# Altium footprint library 6-Connectors-5.PcbLib: 46 footprints (part 1 of 5)
Each footprint in its own frame and in the unit in brackets; x right, y up, seen from the top. Pads: shape width x height; smd on the part's side, far side on the other; paste and mask are expansions set on the pad; w line width, h text height; cw(c..) or ccw(c..) is an arc to the next point about the centre after c.
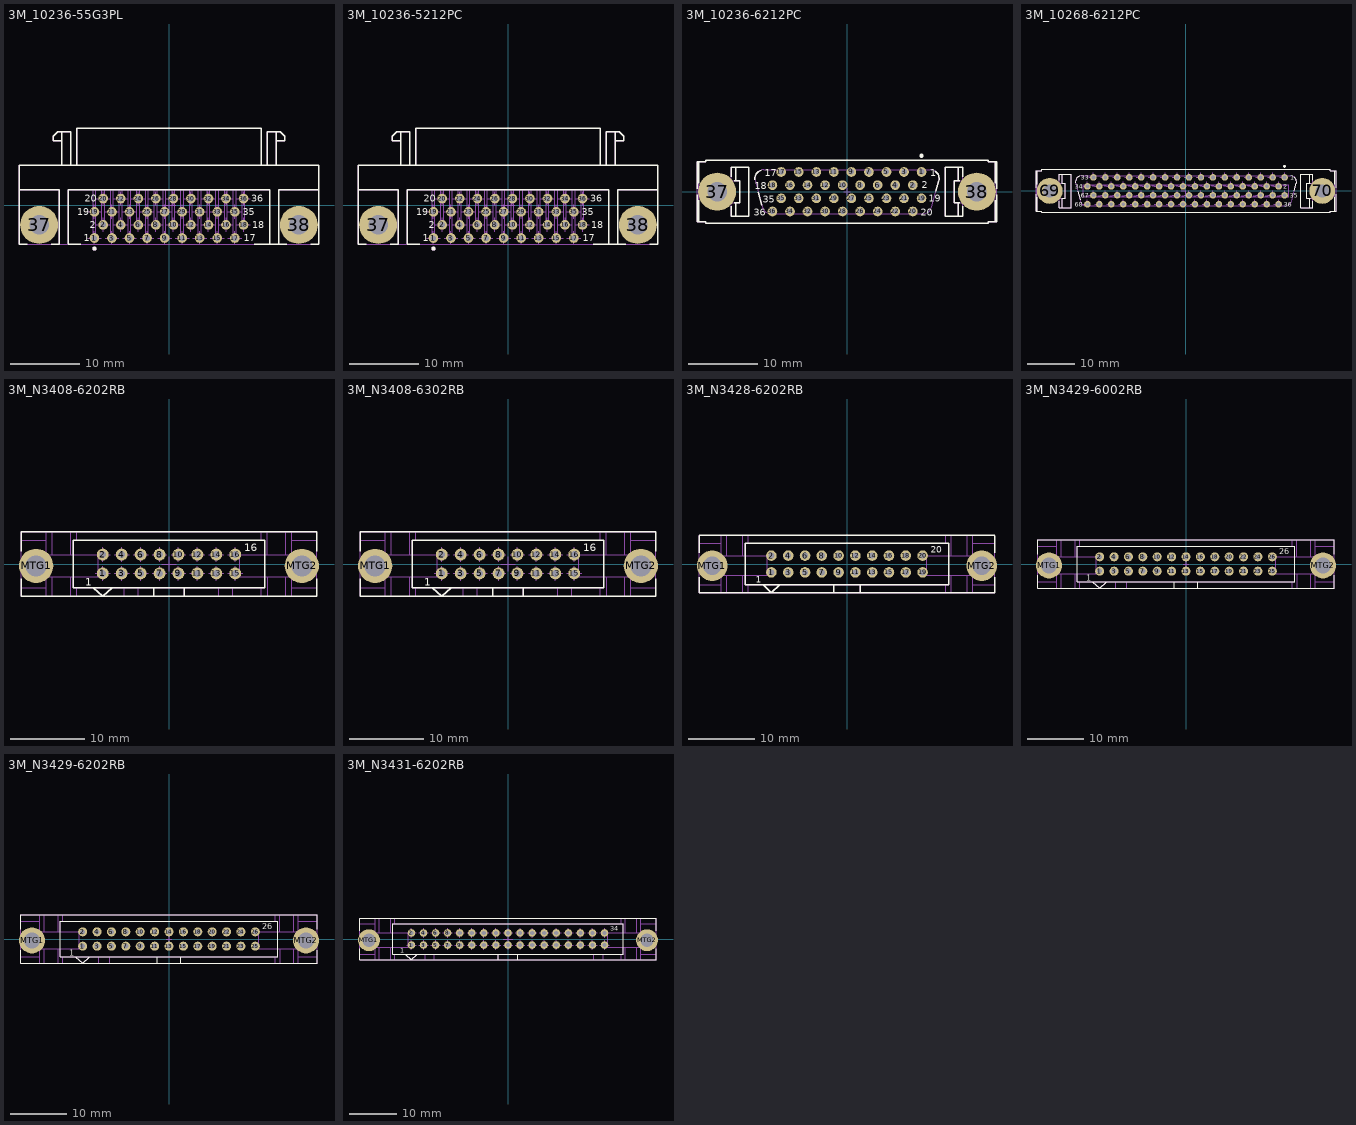
[diagram p0: the footprints below, top view; thin cyan lines are the x and y axes]

## 3M_10236-55G3PL [mm] "36 contacts, Mini D Ribbon (MDR), 102 Series, .050\" Boardmount Through-hole Right Angle Receptacle-Shielded"
height 9.4
pads (38):
  round 1.4 hole 0.8: 1(-10.795,-4.758) 2(-9.525,-2.853) 3(-8.255,-4.758) 4(-6.985,-2.853) 5(-5.715,-4.758) 6(-4.445,-2.853) 7(-3.175,-4.758) 8(-1.905,-2.853) 9(-0.635,-4.758) 10(0.635,-2.853) 11(1.905,-4.758) 12(3.175,-2.853) 13(4.445,-4.758) 14(5.715,-2.853) 15(6.985,-4.758) 16(8.255,-2.853) 17(9.525,-4.758) 18(10.795,-2.853) 19(-10.795,-0.957) 20(-9.525,0.957) 21(-8.255,-0.957) 22(-6.985,0.957) 23(-5.715,-0.957) 24(-4.445,0.957) 25(-3.175,-0.957) 26(-1.905,0.957) 27(-0.635,-0.957) 28(0.635,0.957) 29(1.905,-0.957) 30(3.175,0.957) 31(4.445,-0.957) 32(5.715,0.957) 33(6.985,-0.957) 34(8.255,0.957) 35(9.525,-0.957) 36(10.795,0.957)
  round 5.5 hole 2.8: 37(-18.796,-2.853) 38(18.796,-2.853)
Top Overlay:
  circle w0.3: c-10.795,-6.282 r0.15
  lines w0.2: -21.717,2.227 -15.875,2.227 -15.875,-5.647 -17.084,-5.647 ; -20.508,-5.647 -21.717,-5.647 -21.717,5.783 21.717,5.783 21.717,-5.647 20.508,-5.647 ; -15.494,5.783 -15.494,10.609 ; -15.494,9.339 -16.764,9.339 -16.764,9.974 -16.129,10.609 -14.224,10.609 -14.224,5.783 ; -13.335,5.783 -13.335,11.117 13.334,11.117 13.336,5.783 ; -12.77,-5.647 -14.605,-5.647 -14.605,2.227 14.605,2.227 14.605,-5.647 ; 12.349,-5.647 15.875,-5.647 ; 14.224,5.783 14.224,10.609 16.129,10.609 16.764,9.974 16.764,9.339 15.494,9.339 ; 15.494,5.783 15.494,10.609 ; 17.084,-5.647 15.875,-5.647 ; 21.717,2.227 15.875,2.227 15.875,-5.647
  text "36" at 11.935,0.468 h1.02
  text "18" at 12.06,-3.342 h1.02
  text "17" at 10.8,-5.247 h1.02
  text "35" at 10.675,-1.446 h1.02
  text "19" at -13.315,-1.441 h1.02
  text "20" at -12.195,0.473 h1.02
  text "2" at -11.495,-3.337 h1.02
  text "1" at -12.365,-5.242 h1.02
Mechanical 8:
  drawing of 156 lines, arcs and shapes, not listed
Mechanical 14:
  circle w0.3: c-10.795,-6.282 r0.15
  lines w0.1: -21.717,2.227 -15.875,2.227 -15.875,-5.647 ; -15.494,5.783 -15.494,10.609 ; -15.494,9.339 -16.764,9.339 -16.764,9.974 -16.129,10.609 -14.224,10.609 -14.224,5.783 ; -14.605,-5.647 -14.605,2.227 14.605,2.227 14.605,-5.647 ; -13.335,5.783 -13.335,11.117 13.334,11.117 13.336,5.783 ; -10.994,2.227 -10.994,-4.957 -10.596,-4.957 -10.596,2.227 ; -9.724,2.227 -9.724,-3.052 -9.326,-3.052 -9.326,2.227 ; -8.454,2.227 -8.454,-4.957 -8.056,-4.957 -8.056,2.227 ; -7.184,2.227 -7.184,-3.052 -6.786,-3.052 -6.786,2.227 ; -5.914,2.227 -5.914,-4.957 -5.516,-4.957 -5.516,2.227 ; -4.644,2.227 -4.644,-3.052 -4.246,-3.052 -4.246,2.227 ; -3.374,2.227 -3.374,-4.957 -2.976,-4.957 -2.976,2.227 ; -2.104,2.227 -2.104,-3.052 -1.706,-3.052 -1.706,2.227 ; -0.834,2.227 -0.834,-4.957 -0.436,-4.957 -0.436,2.227 ; 0.436,2.227 0.436,-3.052 0.834,-3.052 0.834,2.227 ; 1.706,2.227 1.706,-4.957 2.104,-4.957 2.104,2.227 ; 2.976,2.227 2.976,-3.052 3.374,-3.052 3.374,2.227 ; 4.246,2.227 4.246,-4.957 4.644,-4.957 4.644,2.227 ; 5.516,2.227 5.516,-3.052 5.914,-3.052 5.914,2.227 ; 6.786,2.227 6.786,-4.957 7.184,-4.957 7.184,2.227 ; 8.056,2.227 8.056,-3.052 8.454,-3.052 8.454,2.227 ; 9.326,2.227 9.326,-4.957 9.724,-4.957 9.724,2.227 ; 10.596,2.227 10.596,-3.052 10.994,-3.052 10.994,2.227 ; 14.224,5.783 14.224,10.609 16.129,10.609 16.764,9.974 16.764,9.339 15.494,9.339 ; 15.494,5.783 15.494,10.609 ; 15.875,-5.647 15.875,2.227 21.717,2.227 ; -21.717,-5.647 21.717,-5.647 21.717,5.783 -21.717,5.783 -21.717,-5.647 ; -19.05,-5.031 -18.542,-5.031 -18.542,-4.071 ccw(c-18.796,-2.853) -18.542,-1.634 -18.542,-0.675 -19.05,-0.675 -19.05,-1.634 ccw(c-18.796,-2.853) -19.05,-4.071 -19.05,-5.031 ; 18.542,-5.031 19.05,-5.031 19.05,-4.071 ccw(c18.796,-2.853) 19.05,-1.634 19.05,-0.675 18.542,-0.675 18.542,-1.634 ccw(c18.796,-2.853) 18.542,-4.071 18.542,-5.031
  text "36" at 11.935,0.468 h1.02
  text "18" at 12.06,-3.342 h1.02
  text "17" at 10.8,-5.247 h1.02
  text "35" at 10.675,-1.446 h1.02
  text "19" at -13.315,-1.441 h1.02
  text "20" at -12.195,0.473 h1.02
  text "2" at -11.495,-3.337 h1.02
  text "1" at -12.365,-5.242 h1.02
3D body "3M_10236-55G3PL.stp": height 9.4, standoff -3.81, extent -21.717,-5.647 21.717,11.117

## 3M_10236-5212PC [mm] "36 contacts, Mini D Ribbon (MDR), 102 Series, .050\" Boardmount Through-hole Right Angle Receptacle-Shielded"
height 9.4
pads (38):
  round 1.4 hole 0.8: 1(-10.795,-4.758) 2(-9.525,-2.853) 3(-8.255,-4.758) 4(-6.985,-2.853) 5(-5.715,-4.758) 6(-4.445,-2.853) 7(-3.175,-4.758) 8(-1.905,-2.853) 9(-0.635,-4.758) 10(0.635,-2.853) 11(1.905,-4.758) 12(3.175,-2.853) 13(4.445,-4.758) 14(5.715,-2.853) 15(6.985,-4.758) 16(8.255,-2.853) 17(9.525,-4.758) 18(10.795,-2.853) 19(-10.795,-0.957) 20(-9.525,0.957) 21(-8.255,-0.957) 22(-6.985,0.957) 23(-5.715,-0.957) 24(-4.445,0.957) 25(-3.175,-0.957) 26(-1.905,0.957) 27(-0.635,-0.957) 28(0.635,0.957) 29(1.905,-0.957) 30(3.175,0.957) 31(4.445,-0.957) 32(5.715,0.957) 33(6.985,-0.957) 34(8.255,0.957) 35(9.525,-0.957) 36(10.795,0.957)
  round 5.5 hole 2.8: 37(-18.796,-2.853) 38(18.796,-2.853)
Top Overlay:
  circle w0.3: c-10.795,-6.282 r0.15
  lines w0.2: -21.717,2.227 -15.875,2.227 -15.875,-5.647 -17.084,-5.647 ; -20.508,-5.647 -21.717,-5.647 -21.717,5.783 21.717,5.783 21.717,-5.647 20.508,-5.647 ; -15.494,5.783 -15.494,10.609 ; -15.494,9.339 -16.764,9.339 -16.764,9.974 -16.129,10.609 -14.224,10.609 -14.224,5.783 ; -13.335,5.783 -13.335,11.117 13.334,11.117 13.336,5.783 ; -12.77,-5.647 -14.605,-5.647 -14.605,2.227 14.605,2.227 14.605,-5.647 ; 12.349,-5.647 15.875,-5.647 ; 14.224,5.783 14.224,10.609 16.129,10.609 16.764,9.974 16.764,9.339 15.494,9.339 ; 15.494,5.783 15.494,10.609 ; 17.084,-5.647 15.875,-5.647 ; 21.717,2.227 15.875,2.227 15.875,-5.647
  text "1" at -12.365,-5.242 h1.02
  text "2" at -11.495,-3.337 h1.02
  text "20" at -12.195,0.473 h1.02
  text "19" at -13.315,-1.441 h1.02
  text "35" at 10.675,-1.446 h1.02
  text "17" at 10.8,-5.247 h1.02
  text "18" at 12.06,-3.342 h1.02
  text "36" at 11.935,0.468 h1.02
Mechanical 8:
  drawing of 156 lines, arcs and shapes, not listed
Mechanical 14:
  circle w0.3: c-10.795,-6.282 r0.15
  lines w0.1: -21.717,2.227 -15.875,2.227 -15.875,-5.647 ; -15.494,5.783 -15.494,10.609 ; -15.494,9.339 -16.764,9.339 -16.764,9.974 -16.129,10.609 -14.224,10.609 -14.224,5.783 ; -14.605,-5.647 -14.605,2.227 14.605,2.227 14.605,-5.647 ; -13.335,5.783 -13.335,11.117 13.334,11.117 13.336,5.783 ; -10.994,2.227 -10.994,-4.957 -10.596,-4.957 -10.596,2.227 ; -9.724,2.227 -9.724,-3.052 -9.326,-3.052 -9.326,2.227 ; -8.454,2.227 -8.454,-4.957 -8.056,-4.957 -8.056,2.227 ; -7.184,2.227 -7.184,-3.052 -6.786,-3.052 -6.786,2.227 ; -5.914,2.227 -5.914,-4.957 -5.516,-4.957 -5.516,2.227 ; -4.644,2.227 -4.644,-3.052 -4.246,-3.052 -4.246,2.227 ; -3.374,2.227 -3.374,-4.957 -2.976,-4.957 -2.976,2.227 ; -2.104,2.227 -2.104,-3.052 -1.706,-3.052 -1.706,2.227 ; -0.834,2.227 -0.834,-4.957 -0.436,-4.957 -0.436,2.227 ; 0.436,2.227 0.436,-3.052 0.834,-3.052 0.834,2.227 ; 1.706,2.227 1.706,-4.957 2.104,-4.957 2.104,2.227 ; 2.976,2.227 2.976,-3.052 3.374,-3.052 3.374,2.227 ; 4.246,2.227 4.246,-4.957 4.644,-4.957 4.644,2.227 ; 5.516,2.227 5.516,-3.052 5.914,-3.052 5.914,2.227 ; 6.786,2.227 6.786,-4.957 7.184,-4.957 7.184,2.227 ; 8.056,2.227 8.056,-3.052 8.454,-3.052 8.454,2.227 ; 9.326,2.227 9.326,-4.957 9.724,-4.957 9.724,2.227 ; 10.596,2.227 10.596,-3.052 10.994,-3.052 10.994,2.227 ; 14.224,5.783 14.224,10.609 16.129,10.609 16.764,9.974 16.764,9.339 15.494,9.339 ; 15.494,5.783 15.494,10.609 ; 15.875,-5.647 15.875,2.227 21.717,2.227 ; -21.717,-5.647 21.717,-5.647 21.717,5.783 -21.717,5.783 -21.717,-5.647 ; -19.05,-5.031 -18.542,-5.031 -18.542,-4.071 ccw(c-18.796,-2.853) -18.542,-1.634 -18.542,-0.675 -19.05,-0.675 -19.05,-1.634 ccw(c-18.796,-2.853) -19.05,-4.071 -19.05,-5.031 ; 18.542,-5.031 19.05,-5.031 19.05,-4.071 ccw(c18.796,-2.853) 19.05,-1.634 19.05,-0.675 18.542,-0.675 18.542,-1.634 ccw(c18.796,-2.853) 18.542,-4.071 18.542,-5.031
  text "1" at -12.365,-5.242 h1.02
  text "2" at -11.495,-3.337 h1.02
  text "20" at -12.195,0.473 h1.02
  text "19" at -13.315,-1.441 h1.02
  text "35" at 10.675,-1.446 h1.02
  text "17" at 10.8,-5.247 h1.02
  text "18" at 12.06,-3.342 h1.02
  text "36" at 11.935,0.468 h1.02
3D body "v160-080.stp": height 0.02, standoff -1.65, extent -11.595,-1.757 -9.995,-0.157
3D body "v160-080.stp": height 0.02, standoff -1.65, extent -7.785,0.157 -6.185,1.757
3D body "v160-080.stp": height 0.02, standoff -1.65, extent -10.325,0.157 -8.725,1.757
3D body "3M_10236-5212PC.stp": height 9.4, standoff -3.81, extent -21.717,-5.647 21.717,11.117

## 3M_10236-6212PC [mm] "36 contacts, Mini D Ribbon (MDR), 102 Series, .050\" Boardmount Through-hole Vertical Receptacle-Shielded"
height 9.4
pads (38):
  round 1.4 hole 0.8: 1(10.795,2.86) 2(9.525,0.955) 3(8.255,2.86) 4(6.985,0.955) 5(5.715,2.86) 6(4.445,0.955) 7(3.175,2.86) 8(1.905,0.955) 9(0.635,2.86) 10(-0.635,0.955) 11(-1.905,2.86) 12(-3.175,0.955) 13(-4.445,2.86) 14(-5.715,0.955) 15(-6.985,2.86) 16(-8.255,0.955) 17(-9.525,2.86) 18(-10.795,0.955) 19(10.795,-0.955) 20(9.525,-2.86) 21(8.255,-0.955) 22(6.985,-2.86) 23(5.715,-0.955) 24(4.445,-2.86) 25(3.175,-0.955) 26(1.905,-2.86) 27(0.635,-0.955) 28(-0.635,-2.86) 29(-1.905,-0.955) 30(-3.175,-2.86) 31(-4.445,-0.955) 32(-5.715,-2.86) 33(-6.985,-0.955) 34(-8.255,-2.86) 35(-9.525,-0.955) 36(-10.795,-2.86)
  round 5.5 hole 2.8: 37(-18.796,0) 38(18.796,0)
Top Overlay:
  circle w0.3: c10.795,5.207 r0.15
  lines w0.2: -21.717,-0.413 -21.717,-4.318 -20.447,-4.318 -20.447,-4.572 20.447,-4.572 20.447,-4.318 21.717,-4.318 21.717,-0.413 ; -21.717,0.413 -21.717,4.318 -20.447,4.318 -20.447,4.572 20.447,4.572 20.447,4.318 21.717,4.318 21.717,0.413 ; -21.463,-4.318 -21.463,-1.261 ; -21.463,1.261 -21.463,4.318 ; -16.764,-2.139 -16.764,-3.556 -14.224,-3.556 -14.224,3.556 -16.764,3.556 -16.764,2.139 ; -16.31,-1.587 -15.494,-1.587 -15.494,1.587 -16.31,1.587 ; -16.129,-3.556 -16.129,-1.587 ; -16.129,1.587 -16.129,3.556 ; -13.323,1.725 cw(c-12.065,1.896) -12.392,3.123 ; -12.86,-0.044 -12.355,-1.928 ; 12.811,2.933 cw(c12.065,1.905) 13.292,1.576 12.878,0.032 ; 16.129,-3.556 16.129,-1.587 ; 16.129,1.587 16.129,3.556 ; 16.31,-1.587 15.494,-1.587 15.494,1.587 16.31,1.587 ; 16.764,-2.139 16.764,-3.556 14.224,-3.556 14.224,3.556 16.764,3.556 16.764,2.139 ; 21.463,-4.318 21.463,-1.261 ; 21.463,1.261 21.463,4.318
  text "1" at 12.019,2.246 h1.02
  text "2" at 10.857,0.468 h1.02
  text "20" at 10.665,-3.459 h1.02
  text "19" at 11.831,-1.436 h1.02
  text "35" at -12.185,-1.569 h1.02
  text "17" at -11.933,2.241 h1.02
  text "18" at -13.34,0.336 h1.02
  text "36" at -13.465,-3.464 h1.02
Mechanical 8:
  drawing of 156 lines, arcs and shapes, not listed
Mechanical 14:
  circle w0.1: c18.796,0 r1.245
  circle w0.1: c-18.796,0 r1.245
  lines w0.1: -21.463,-4.318 -21.463,4.318 ; -16.129,-3.556 -16.129,-1.587 ; -16.129,1.587 -16.129,3.556 ; 16.129,-3.556 16.129,-1.587 ; 16.129,1.587 16.129,3.556 ; 21.463,-4.318 21.463,4.318 ; -21.717,-4.318 -20.447,-4.318 -20.447,-4.572 20.447,-4.572 20.447,-4.318 21.717,-4.318 21.717,4.318 20.447,4.318 20.447,4.572 -20.447,4.572 -20.447,4.318 -21.717,4.318 -21.717,-4.318 ; -16.764,-3.556 -14.224,-3.556 -14.224,3.556 -16.764,3.556 -16.764,1.587 -15.494,1.587 -15.494,-1.587 -16.764,-1.587 -16.764,-3.556 ; -13.292,1.576 cw(c-12.065,1.905) -12.065,3.175 12.065,3.175 cw(c12.065,1.905) 13.292,1.576 12.286,-2.178 cw(c11.015,-1.868) 10.987,-3.175 -10.987,-3.175 cw(c-11.015,-1.868) -12.286,-2.178 -13.292,1.576 ; 14.224,-3.556 16.764,-3.556 16.764,-1.587 15.494,-1.587 15.494,1.587 16.764,1.587 16.764,3.556 14.224,3.556 14.224,-3.556
  text "35" at -12.185,-1.569 h1.02
  text "17" at -11.933,2.241 h1.02
  text "18" at -13.34,0.336 h1.02
  text "36" at -13.465,-3.464 h1.02
  text "1" at 12.019,2.246 h1.02
  text "2" at 10.857,0.468 h1.02
  text "20" at 10.665,-3.459 h1.02
  text "19" at 11.831,-1.436 h1.02
3D body "3M_10236-6212PC.stp": height 11.18, standoff -3.4, extent -21.717,-4.572 21.717,4.572

## 3M_10268-6212PC [mm] "68 contacts, Mini D Ribbon (MDR), .050\" Boardmount Through-hole Vertical Receptacle - Shielded"
height 11
pads (70):
  round 1.4 hole 0.8: 1(20.955,2.858) 2(19.685,0.953) 3(18.415,2.858) 4(17.145,0.953) 5(15.875,2.858) 6(14.605,0.953) 7(13.335,2.858) 8(12.065,0.953) 9(10.795,2.858) 10(9.525,0.953) 11(8.255,2.858) 12(6.985,0.953) 13(5.715,2.858) 14(4.445,0.953) 15(3.175,2.858) 16(1.905,0.953) 17(0.635,2.858) 18(-0.635,0.953) 19(-1.905,2.858) 20(-3.175,0.953) 21(-4.445,2.858) 22(-5.715,0.953) 23(-6.985,2.858) 24(-8.255,0.953) 25(-9.525,2.858) 26(-10.795,0.953) 27(-12.065,2.858) 28(-13.335,0.953) 29(-14.605,2.858) 30(-15.875,0.953) 31(-17.145,2.858) 32(-18.415,0.953) 33(-19.685,2.858) 34(-20.955,0.953) 35(20.955,-0.952) 36(19.685,-2.857) 37(18.415,-0.952) 38(17.145,-2.857) 39(15.875,-0.952) 40(14.605,-2.857) 41(13.335,-0.952) 42(12.065,-2.857) 43(10.795,-0.952) 44(9.525,-2.857) 45(8.255,-0.952) 46(6.985,-2.857) 47(5.715,-0.952) 48(4.445,-2.857) 49(3.175,-0.952) 50(1.905,-2.857) 51(0.635,-0.952) 52(-0.635,-2.857) 53(-1.905,-0.952) 54(-3.175,-2.857) 55(-4.445,-0.952) 56(-5.715,-2.857) 57(-6.985,-0.952) 58(-8.255,-2.857) 59(-9.525,-0.952) 60(-10.795,-2.857) 61(-12.065,-0.952) 62(-13.335,-2.857) 63(-14.605,-0.952) 64(-15.875,-2.857) 65(-17.145,-0.952) 66(-18.415,-2.857) 67(-19.685,-0.952) 68(-20.955,-2.857)
  round 5.5 hole 2.8: 69(-28.956,0) 70(28.956,0)
Top Overlay:
  circle w0.3: c20.955,5.207 r0.15
  lines w0.2: -31.877,-0.684 -31.877,-4.318 -30.607,-4.318 -30.607,-4.572 30.607,-4.572 30.607,-4.318 31.877,-4.318 31.877,-0.684 ; -31.877,0.684 -31.877,4.318 -30.607,4.318 -30.607,4.572 30.607,4.572 30.607,4.318 31.877,4.318 31.877,0.684 ; -31.623,-4.318 -31.623,-1.374 ; -31.623,1.374 -31.623,4.318 ; -26.924,-2.207 -26.924,-3.556 -24.384,-3.556 -24.384,3.556 -26.924,3.556 -26.924,2.207 ; -26.41,-1.587 -25.654,-1.587 -25.654,1.588 -26.41,1.588 ; -26.289,-3.556 -26.289,-1.587 ; -26.289,1.588 -26.289,3.556 ; -23.483,1.734 cw(c-22.225,1.905) -22.551,3.132 ; -23.02,-0.035 -22.515,-1.919 ; 22.971,2.933 cw(c22.225,1.905) 23.452,1.576 23.038,0.032 ; 26.289,-3.556 26.289,-1.587 ; 26.289,1.588 26.289,3.556 ; 26.41,-1.587 25.654,-1.587 25.654,1.588 26.41,1.588 ; 26.924,-2.207 26.924,-3.556 24.384,-3.556 24.384,3.556 26.924,3.556 26.924,2.207 ; 31.623,-4.318 31.623,-1.374 ; 31.623,1.374 31.623,4.318
  text "68" at -23.67,-3.357 h1.02
  text "67" at -22.4,-1.452 h1.02
  text "33" at -22.4,2.358 h1.02
  text "34" at -23.693,0.453 h1.02
  text "36" at 20.804,-3.357 h1.02
  text "35" at 22.051,-1.452 h1.02
  text "2" at 20.622,0.453 h1.02
  text "1" at 22.106,2.358 h1.02
Mechanical 8:
  lines w0.1: -29.956,0 -28.956,0 -28.956,1 ; -21.955,-2.857 -20.955,-2.857 -20.955,-1.857 ; -21.955,0.953 -20.955,0.953 -20.955,1.953 ; -20.685,-0.952 -19.685,-0.952 -19.685,0.048 ; -20.685,2.858 -19.685,2.858 -19.685,3.858 ; -19.415,-2.857 -18.415,-2.857 -18.415,-1.857 ; -19.415,0.953 -18.415,0.953 -18.415,1.953 ; -18.145,-0.952 -17.145,-0.952 -17.145,0.048 ; -18.145,2.858 -17.145,2.858 -17.145,3.858 ; -16.875,-2.857 -15.875,-2.857 -15.875,-1.857 ; -16.875,0.953 -15.875,0.953 -15.875,1.953 ; -15.605,-0.952 -14.605,-0.952 -14.605,0.048 ; -15.605,2.858 -14.605,2.858 -14.605,3.858 ; -14.335,-2.857 -13.335,-2.857 -13.335,-1.857 ; -14.335,0.953 -13.335,0.953 -13.335,1.953 ; -13.065,-0.952 -12.065,-0.952 -12.065,0.048 ; -13.065,2.858 -12.065,2.858 -12.065,3.858 ; -11.795,-2.857 -10.795,-2.857 -10.795,-1.857 ; -11.795,0.953 -10.795,0.953 -10.795,1.953 ; -10.525,-0.952 -9.525,-0.952 -9.525,0.048 ; -10.525,2.858 -9.525,2.858 -9.525,3.858 ; -9.255,-2.857 -8.255,-2.857 -8.255,-1.857 ; -9.255,0.953 -8.255,0.953 -8.255,1.953 ; -7.985,-0.952 -6.985,-0.952 -6.985,0.048 ; -7.985,2.858 -6.985,2.858 -6.985,3.858 ; -6.715,-2.857 -5.715,-2.857 -5.715,-1.857 ; -6.715,0.953 -5.715,0.953 -5.715,1.953 ; -5.445,-0.952 -4.445,-0.952 -4.445,0.048 ; -5.445,2.858 -4.445,2.858 -4.445,3.858 ; -4.175,-2.857 -3.175,-2.857 -3.175,-1.857 ; -4.175,0.953 -3.175,0.953 -3.175,1.953 ; -2.905,-0.952 -1.905,-0.952 -1.905,0.048 ; -2.905,2.858 -1.905,2.858 -1.905,3.858 ; -1.635,-2.857 -0.635,-2.857 -0.635,-1.857 ; -1.635,0.953 -0.635,0.953 -0.635,1.953 ; -1,0 0,0 0,-1 ; -0.365,-0.952 0.635,-0.952 0.635,0.048 ; -0.365,2.858 0.635,2.858 0.635,3.858 ; 0.905,-2.857 1.905,-2.857 1.905,-1.857 ; 0.905,0.953 1.905,0.953 1.905,1.953 ; 2.175,-0.952 3.175,-0.952 3.175,0.048 ; 2.175,2.858 3.175,2.858 3.175,3.858 ; 3.445,-2.857 4.445,-2.857 4.445,-1.857 ; 3.445,0.953 4.445,0.953 4.445,1.953 ; 4.715,-0.952 5.715,-0.952 5.715,0.048 ; 4.715,2.858 5.715,2.858 5.715,3.858 ; 5.985,-2.857 6.985,-2.857 6.985,-1.857 ; 5.985,0.953 6.985,0.953 6.985,1.953 ; 7.255,-0.952 8.255,-0.952 8.255,0.048 ; 7.255,2.858 8.255,2.858 8.255,3.858 ; 8.525,-2.857 9.525,-2.857 9.525,-1.857 ; 8.525,0.953 9.525,0.953 9.525,1.953 ; 9.795,-0.952 10.795,-0.952 10.795,0.048 ; 9.795,2.858 10.795,2.858 10.795,3.858 ; 11.065,-2.857 12.065,-2.857 12.065,-1.857 ; 11.065,0.953 12.065,0.953 12.065,1.953 ; 12.335,-0.952 13.335,-0.952 13.335,0.048 ; 12.335,2.858 13.335,2.858 13.335,3.858 ; 13.605,-2.857 14.605,-2.857 14.605,-1.857 ; 13.605,0.953 14.605,0.953 14.605,1.953 ; 14.875,-0.952 15.875,-0.952 15.875,0.048 ; 14.875,2.858 15.875,2.858 15.875,3.858 ; 16.145,-2.857 17.145,-2.857 17.145,-1.857 ; 16.145,0.953 17.145,0.953 17.145,1.953 ; 17.415,-0.952 18.415,-0.952 18.415,0.048 ; 17.415,2.858 18.415,2.858 18.415,3.858 ; 18.685,-2.857 19.685,-2.857 19.685,-1.857 ; 18.685,0.953 19.685,0.953 19.685,1.953 ; 19.955,-0.952 20.955,-0.952 20.955,0.048 ; 19.955,2.858 20.955,2.858 20.955,3.858 ; 27.956,0 28.956,0 28.956,1
Mechanical 14:
  drawing of 252 lines, arcs and shapes, not listed
3D body "3M-10268-6212PC.stp": height 11.18, standoff -3.4, extent -31.877,-4.572 31.877,4.572

## 3M_N3408-6202RB [mm] "3M, 3000 Series, 16 Contacts - Pitch 2.54mm - Straight Four-Wall Header (Black) With Short Roll Pin Latch/Ejectors"
height 24.6
pads (18):
  round 1.6 hole 0.9: 1(-8.89,-1.27) 2(-8.89,1.27) 3(-6.35,-1.27) 4(-6.35,1.27) 5(-3.81,-1.27) 6(-3.81,1.27) 7(-1.27,-1.27) 8(-1.27,1.27) 9(1.27,-1.27) 10(1.27,1.27) 11(3.81,-1.27) 12(3.81,1.27) 13(6.35,-1.27) 14(6.35,1.27) 15(8.89,-1.27) 16(8.89,1.27)
  round 4.6 hole 2.8: MTG1(-17.83,-0.254) MTG2(17.83,-0.254)
Top Overlay:
  lines w0.2: -19.812,-2 -19.812,-4.318 19.812,-4.318 19.812,-2 ; -19.812,1.7 -19.812,4.3 ; -19.812,4.318 19.812,4.318 ; -2.032,-4.318 -2.032,-3.175 ; 2.032,-4.318 2.032,-3.175 ; 19.812,1.7 19.812,4.3 ; -12.827,-3.175 12.827,-3.175 12.827,3.175 -12.827,3.175 -12.827,-3.175 ; -10.16,-3.175 -7.62,-3.175 -8.89,-4.318 -10.16,-3.175
  text "16" at 10.125,1.727 h1.02
  text "1" at -11.227,-2.921 h1.02
Mechanical 8:
  lines w0.1: -18.83,-0.254 -17.83,-0.254 ; -17.83,-1.254 -17.83,-0.254 ; -17.83,0.746 -17.83,-0.254 ; -16.83,-0.254 -17.83,-0.254 ; -9.89,-1.27 -8.89,-1.27 ; -9.89,1.27 -8.89,1.27 ; -8.89,-2.27 -8.89,-1.27 ; -8.89,-0.27 -8.89,-1.27 ; -8.89,0.27 -8.89,1.27 ; -8.89,2.27 -8.89,1.27 ; -7.89,-1.27 -8.89,-1.27 ; -7.89,1.27 -8.89,1.27 ; -7.35,-1.27 -6.35,-1.27 ; -7.35,1.27 -6.35,1.27 ; -6.35,-2.27 -6.35,-1.27 ; -6.35,-0.27 -6.35,-1.27 ; -6.35,0.27 -6.35,1.27 ; -6.35,2.27 -6.35,1.27 ; -5.35,-1.27 -6.35,-1.27 ; -5.35,1.27 -6.35,1.27 ; -4.81,-1.27 -3.81,-1.27 ; -4.81,1.27 -3.81,1.27 ; -3.81,-2.27 -3.81,-1.27 ; -3.81,-0.27 -3.81,-1.27 ; -3.81,0.27 -3.81,1.27 ; -3.81,2.27 -3.81,1.27 ; -2.81,-1.27 -3.81,-1.27 ; -2.81,1.27 -3.81,1.27 ; -2.27,-1.27 -1.27,-1.27 ; -2.27,1.27 -1.27,1.27 ; -1.27,-2.27 -1.27,-1.27 ; -1.27,-0.27 -1.27,-1.27 ; -1.27,0.27 -1.27,1.27 ; -1.27,2.27 -1.27,1.27 ; -1,0 0,0 ; -0.27,-1.27 -1.27,-1.27 ; -0.27,1.27 -1.27,1.27 ; 0,-1 0,0 ; 0,1 0,0 ; 0.27,-1.27 1.27,-1.27 ; 0.27,1.27 1.27,1.27 ; 1,0 0,0 ; 1.27,-2.27 1.27,-1.27 ; 1.27,-0.27 1.27,-1.27 ; 1.27,0.27 1.27,1.27 ; 1.27,2.27 1.27,1.27 ; 2.27,-1.27 1.27,-1.27 ; 2.27,1.27 1.27,1.27 ; 2.81,-1.27 3.81,-1.27 ; 2.81,1.27 3.81,1.27 ; 3.81,-2.27 3.81,-1.27 ; 3.81,-0.27 3.81,-1.27 ; 3.81,0.27 3.81,1.27 ; 3.81,2.27 3.81,1.27 ; 4.81,-1.27 3.81,-1.27 ; 4.81,1.27 3.81,1.27 ; 5.35,-1.27 6.35,-1.27 ; 5.35,1.27 6.35,1.27 ; 6.35,-2.27 6.35,-1.27 ; 6.35,-0.27 6.35,-1.27 ; 6.35,0.27 6.35,1.27 ; 6.35,2.27 6.35,1.27 ; 7.35,-1.27 6.35,-1.27 ; 7.35,1.27 6.35,1.27 ; 7.89,-1.27 8.89,-1.27 ; 7.89,1.27 8.89,1.27 ; 8.89,-2.27 8.89,-1.27 ; 8.89,-0.27 8.89,-1.27 ; 8.89,0.27 8.89,1.27 ; 8.89,2.27 8.89,1.27 ; 9.89,-1.27 8.89,-1.27 ; 9.89,1.27 8.89,1.27 ; 16.844,-0.254 17.844,-0.254 ; 17.844,-1.254 17.844,-0.254 ; 17.844,0.746 17.844,-0.254 ; 18.844,-0.254 17.844,-0.254
Mechanical 14:
  circle w0.1: c17.844,-0.254 r1.27
  circle w0.1: c-17.844,-0.254 r1.27
  lines w0.1: -19.812,-3.175 -16.484,-3.175 ; -16.484,-4.318 -16.484,-1.727 -9.525,-1.727 -9.525,1.27 -16.484,1.27 -16.484,4.318 ; -15.642,-4.318 -15.642,-1.727 ; -15.642,1.27 -15.642,4.318 ; -13.209,-4.318 -13.208,-1.727 ; -12.827,-1.727 -12.827,-3.175 12.827,-3.175 12.827,-1.727 ; -12.827,1.27 -12.827,3.175 12.827,3.175 12.827,1.27 ; -6.039,-4.318 -6.039,-3.175 ; -4.121,-4.318 -4.121,-3.175 ; -2.032,-4.318 -2.032,-3.175 ; 2.032,-4.318 2.032,-3.175 ; 6.661,-4.318 6.661,-3.175 ; 8.579,-4.318 8.579,-3.175 ; 12.366,-4.318 12.366,-3.175 ; 12.366,3.175 12.366,4.318 ; 13.208,1.27 13.208,4.318 ; 13.249,-4.318 13.249,-1.727 ; 15.642,-4.318 15.642,-1.727 ; 15.642,1.27 15.642,4.318 ; 16.484,-4.318 16.484,-1.727 9.525,-1.727 9.525,1.27 16.484,1.27 16.484,4.318 ; 16.484,-3.175 19.812,-3.175 ; 16.484,3.175 19.812,3.175 ; -19.812,-4.318 -19.812,4.318 19.812,4.318 19.812,-4.318 -19.812,-4.318 ; -19.812,3.175 -16.484,3.175 -19.812,3.175 ; -19.368,-1.134 -17.844,-2.014 -16.32,-1.134 -16.32,0.626 -17.844,1.506 -19.368,0.626 -19.368,-1.134 ; -13.208,1.27 -13.208,4.318 -13.208,1.27 ; -12.366,-4.318 -12.366,-3.175 -12.366,-4.318 ; -12.366,3.175 -12.366,4.318 -12.366,3.175 ; 16.32,-1.134 17.844,-2.014 19.368,-1.134 19.368,0.626 17.844,1.506 16.32,0.626 16.32,-1.134